# Altium footprint library UWRT_Footprint_Library_2020.PcbLib: 376 footprints (part 24 of 24)
Each footprint in its own frame and in the unit in brackets; x right, y up, seen from the top. Pads: shape width x height; smd on the part's side, far side on the other; paste and mask are expansions set on the pad; w line width, h text height; cw(c..) or ccw(c..) is an arc to the next point about the centre after c.
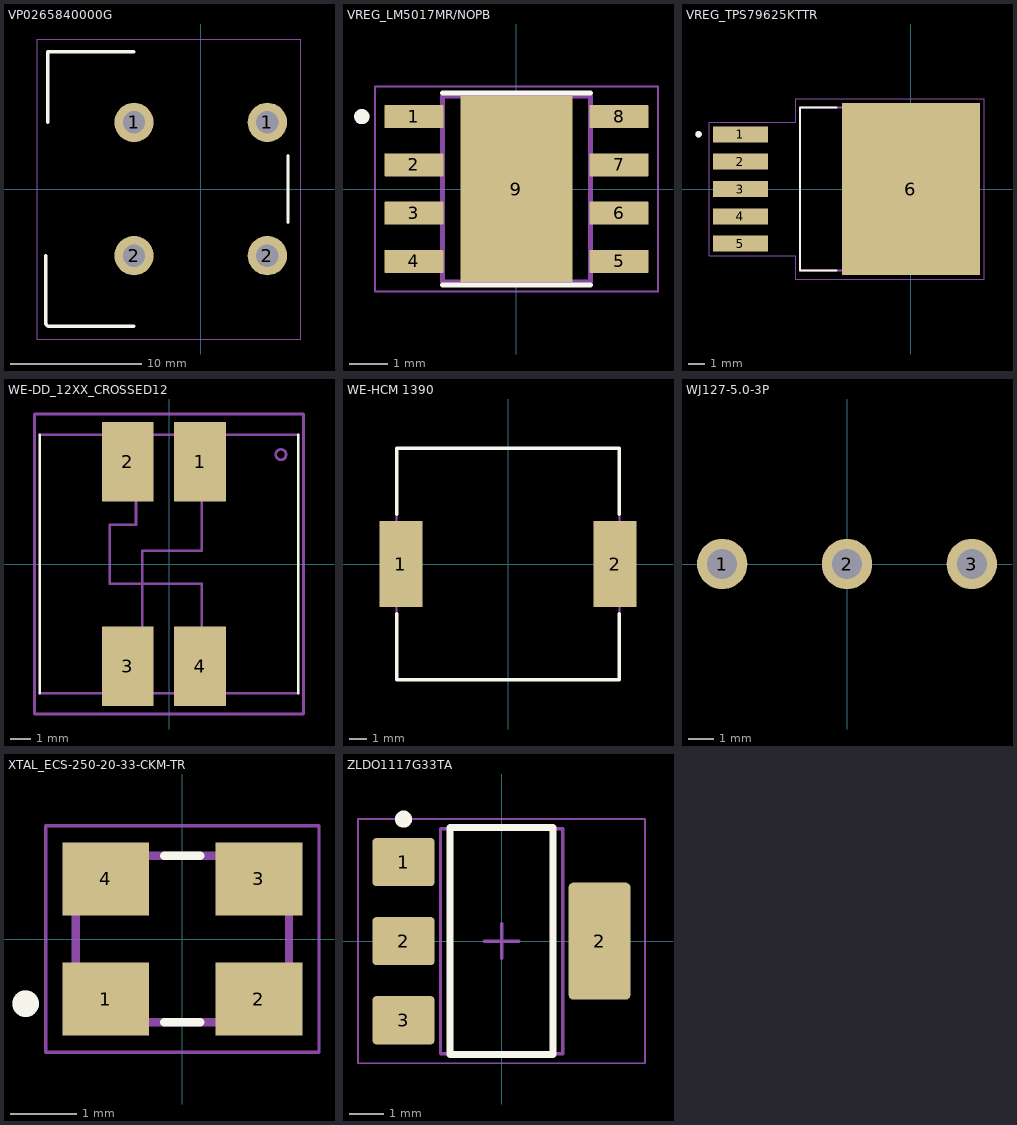
[diagram p23: the footprints below, top view; thin cyan lines are the x and y axes]

## VP0265840000G [mm] "PCB TERMINAL BLOCKS RISING CLAMP"
pads (4):
  round 3 hole 1.7: 1(-5.08,5.08) 1(5.08,5.08) 2(-5.08,-5.08) 2(5.08,-5.08)
Top Overlay:
  lines w0.254: -11.811,-5.08 -11.811,-10.287 -11.638,-10.46 -5.08,-10.46 ; -11.65,5.08 -11.65,10.46 -5.08,10.46 ; 6.65,-2.54 6.65,0 6.65,2.54
Mechanical 15:
  lines w0.064: -12.446,-11.43 7.62,-11.43 7.62,11.43 -12.446,11.43 -12.446,-11.43
3D body "VP0265840000G--3DModel-STEP-269445.STEP": height 28.5, standoff -4.6, extent -11.65,-10.46 6.65,10.46

## VREG_LM5017MR/NOPB [mm]
pads (9):
  rrect5% 1.55x0.6 smd mask+0: 1(-2.7,1.905) 2(-2.7,0.635) 3(-2.7,-0.635) 4(-2.7,-1.905) 5(2.7,-1.905) 6(2.7,-0.635) 7(2.7,0.635) 8(2.7,1.905)
  rect 2.95x4.9 smd paste-3 mask+0: 9(0,0)
Top Overlay:
  circle w0.2: c-4.07,1.905 r0.1
  lines w0.127: -1.95,-2.525 1.95,-2.525 ; -1.95,2.525 1.95,2.525
Top Paste:
  region: 1.355,-1.7 -1.355,-1.7 -1.355,1.7 1.355,1.7
Top Solder:
  drawing of 9 lines, arcs and shapes, not listed
Mechanical 13:
  circle w0.2: c-4.07,1.905 r0.1
  lines w0.127: -1.95,-2.45 1.95,-2.45 1.95,2.45 -1.95,2.45 -1.95,-2.45
Mechanical 15:
  lines w0.05: -3.725,-2.7 3.725,-2.7 3.725,2.7 -3.725,2.7 -3.725,-2.7
3D body "TPS54339DDAR.STEP": height 1.7, standoff 0, extent -3,-2.45 3,2.45

## VREG_TPS79625KTTR [mm]
pads (6):
  rect 3.4x1 smd paste-3 mask+0: 1(-10.6,3.4) 2(-10.6,1.7) 3(-10.6,0) 4(-10.6,-1.7) 5(-10.6,-3.4)
  rect 8.6x10.7 smd paste-6 mask+0: 6(0,0)
Top Overlay:
  circle w0.2: c-13.2,3.4 r0.1
  lines w0.127: -4.62,-5.08 -6.905,-5.08 -6.905,5.08 -4.62,5.08
Top Paste:
  region: -8.95,-3.85 -12.25,-3.85 -12.25,-2.95 -8.95,-2.95
  region: -8.95,-2.15 -12.25,-2.15 -12.25,-1.25 -8.95,-1.25
  region: -8.95,2.95 -12.25,2.95 -12.25,3.85 -8.95,3.85
  region: -8.95,1.25 -12.25,1.25 -12.25,2.15 -8.95,2.15
  region: -8.95,-0.45 -12.25,-0.45 -12.25,0.45 -8.95,0.45
  region: 4.25,-5.3 -4.25,-5.3 -4.25,5.3 4.25,5.3
Top Solder:
  region: -8.83,-3.97 -12.37,-3.97 -12.37,-2.83 -8.83,-2.83
  region: -8.83,-2.27 -12.37,-2.27 -12.37,-1.13 -8.83,-1.13
  region: -8.83,2.83 -12.37,2.83 -12.37,3.97 -8.83,3.97
  region: -8.83,1.13 -12.37,1.13 -12.37,2.27 -8.83,2.27
  region: -8.83,-0.57 -12.37,-0.57 -12.37,0.57 -8.83,0.57
  region: 4.37,-5.42 -4.37,-5.42 -4.37,5.42 4.37,5.42
Mechanical 13:
  circle w0.2: c-13.2,3.4 r0.1
  lines w0.127: -6.905,-5.08 2.02,-5.08 2.02,5.08 -6.905,5.08 -6.905,-5.08
Mechanical 15:
  lines w0.05: -12.55,-4.15 -12.55,4.15 -7.155,4.15 -7.155,5.6 4.55,5.6 4.55,-5.6 -7.155,-5.6 -7.155,-4.15 -12.55,-4.15
3D body "NOPB.STEP": height 4.65, standoff -0.15, extent -10.876,-5.08 3.475,5.08

## WE-DD_12XX_CROSSED12 [mm]
pads (4):
  rect 2.5x3.85 smd: 1(1.5,4.95) 2(-2,4.95) 3(-2,-4.95) 4(1.5,-4.95)
Top Overlay:
  lines w0.127: -6.25,-6.25 -6.25,6.25 ; 6.25,-6.25 6.25,6.25
Mechanical 13:
  circle w0.127: c5.41,5.29 r0.25
  lines w0.127: -6.25,-6.25 6.25,-6.25 ; -6.25,6.25 6.25,6.25 ; -1.587,4.763 -1.598,1.905 -2.857,1.905 -2.857,-0.953 1.587,-0.953 1.587,-4.95 ; -1.29,-4.95 -1.29,0.635 1.587,0.635 1.587,4.804
Mechanical 15:
  lines w0.127: -6.5,-7.25 -6.5,7.25 6.5,7.25 6.5,-7.25 -6.5,-7.25

## WE-HCM 1390 [mm] "SMD Inductor, 2-Leads, Body 12,50x13,00mm"
height 9.5
pads (2):
  rect 2.5x5 smd: 1(-6.25,0) 2(6.25,0)
Top Overlay:
  lines w0.2: -6.5,-2.9 -6.5,-6.75 6.5,-6.75 6.5,-2.9 ; -6.5,2.9 -6.5,6.75 6.5,6.75 6.5,2.9
Mechanical 13:
  lines w0.1: -6.5,-6.75 -6.5,6.75 6.5,6.75 6.5,-6.75 -6.5,-6.75
3D body "7443090xx.stp": height 8.95, standoff -0.05, extent -7,-6.5 7,6.5

## WJ127-5.0-3P [mm] "3 pin screw terminal"
height 10.1
pads (3):
  round 2.02 hole 1.2: 1(-5,0) 2(0,0) 3(5,0)
3D body "User Library-WJ127-5_0-3P.step": height 10.1, standoff -3, extent -7.5,-4.216 7.5,3.884

## XTAL_ECS-250-20-33-CKM-TR [mm]
pads (4):
  rect 1.3x1.1 smd: 1(-1.15,-0.9) 2(1.15,-0.9) 3(1.15,0.9) 4(-1.15,0.9)
Top Overlay:
  circle w0.2: c-2.35,-0.97 r0.1
  lines w0.127: -0.27,-1.25 0.27,-1.25 ; -0.27,1.25 0.27,1.25
Mechanical 13:
  circle w0.2: c-2.35,-0.97 r0.1
  lines w0.127: -1.6,-1.25 -1.6,1.25 1.6,1.25 1.6,-1.25 -1.6,-1.25
Mechanical 15:
  lines w0.05: -2.05,-1.7 -2.05,1.7 2.05,1.7 2.05,-1.7 -2.05,-1.7
3D body "ECS-250-20-33-CKM-TR.STEP": height 0.8, standoff 0, extent -1.617,-1.25 1.583,1.25

## ZLDO1117G33TA [mm] "SOT223, 4-Leads, Body 6.50x7.00mm (avg), Pitch 2.30mm, IPC Medium Density"
height 1.65
pads (4):
  rrect15% 1.8x1.4 smd: 1(-2.85,2.3) 2(-2.85,0) 3(-2.85,-2.3)
  rrect15% 1.8x3.4 smd: 2(2.85,0)
Top Overlay:
  circle w0.25: c-2.85,3.55 r0.125
  lines w0.2: -1.5,-3.3 -1.5,3.3 1.5,3.3 1.5,-3.3 -1.5,-3.3
Mechanical 13:
  lines w0.1: -1.775,-3.275 -1.775,3.275 1.775,3.275 1.775,-3.275 -1.775,-3.275
Mechanical 15:
  lines w0.05: -4.175,-3.55 -4.175,3.55 4.175,3.55 4.175,-3.55 -4.175,-3.55
  lines w0.1: -0.5,0 0.5,0 ; 0,-0.5 0,0.5
3D body "CircuitWorks-SOT-223.STEP": height 1.65, standoff -0.03, extent -3.48,-3.25 3.48,3.25